# Altium footprint library Altium_Lib.PcbLib: 334 footprints (part 12 of 21)
Each footprint in its own frame and in the unit in brackets; x right, y up, seen from the top. Pads: shape width x height; smd on the part's side, far side on the other; paste and mask are expansions set on the pad; w line width, h text height; cw(c..) or ccw(c..) is an arc to the next point about the centre after c.
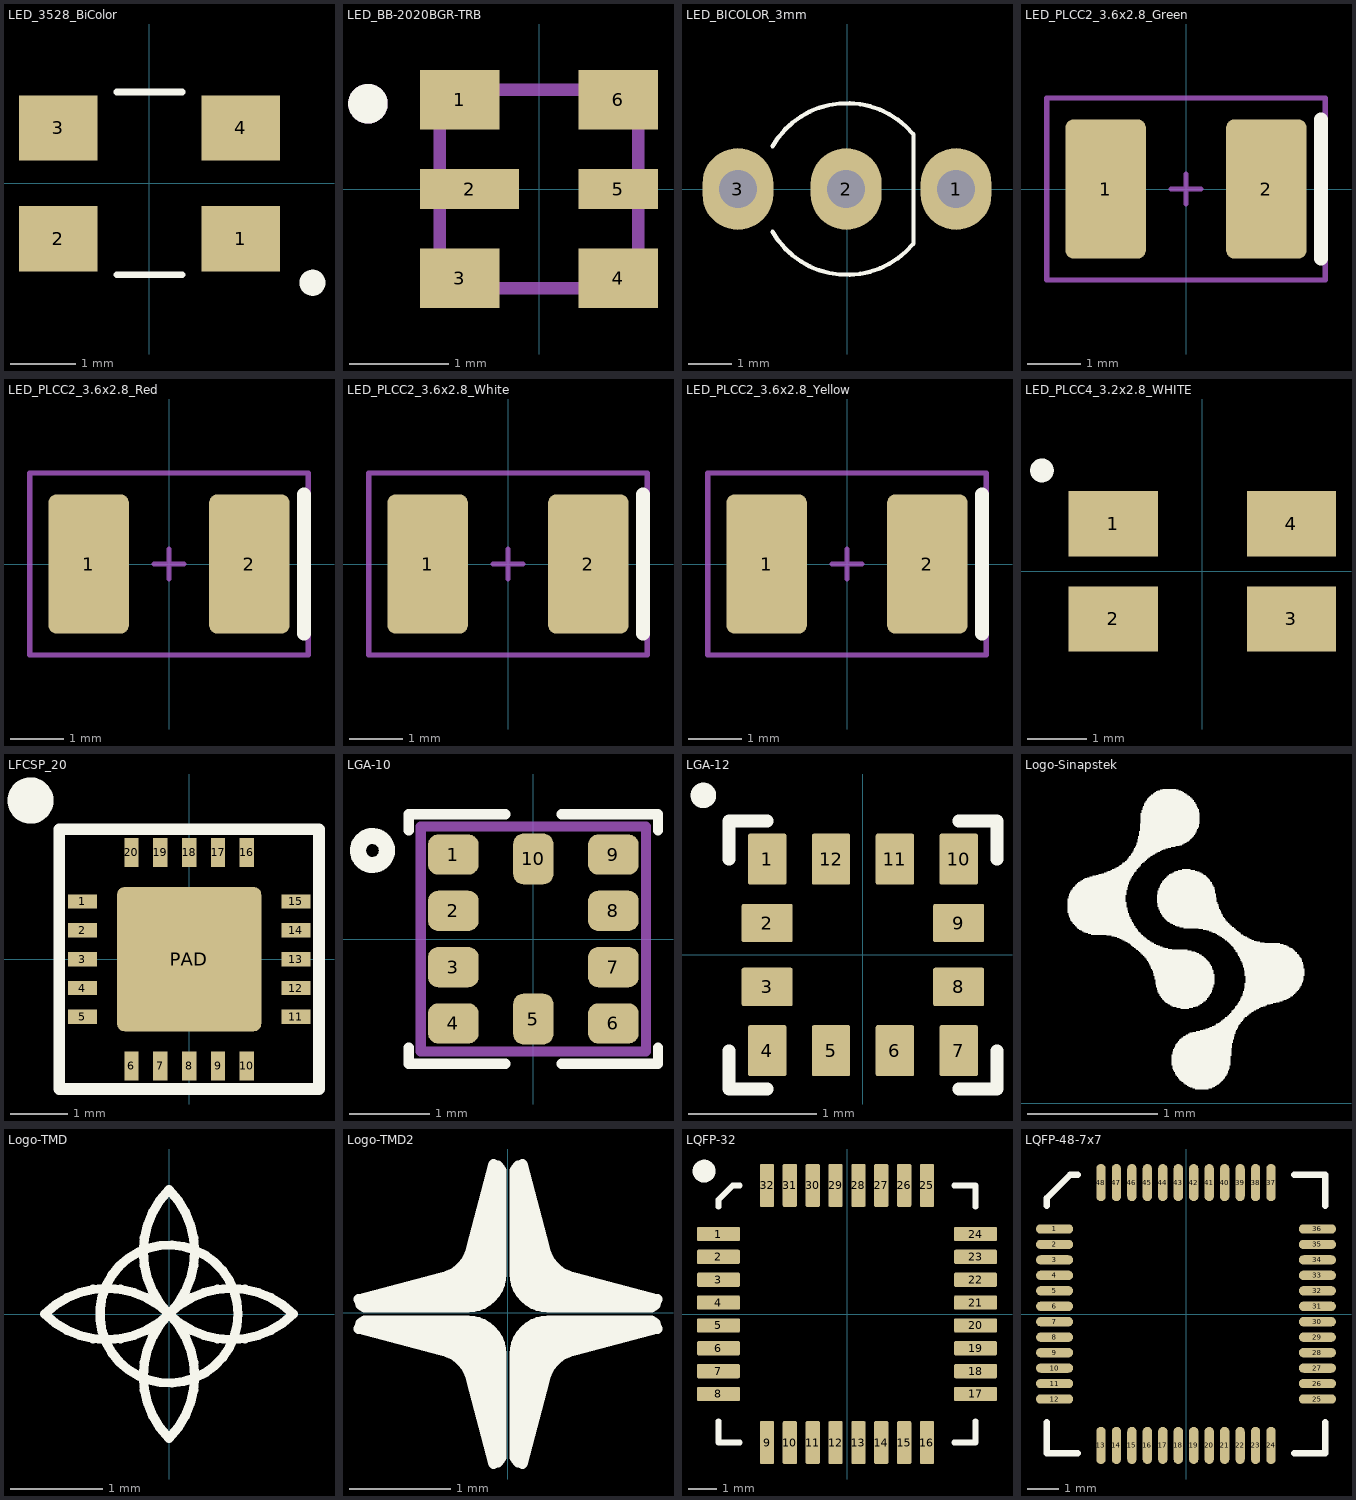
[diagram p11: the footprints below, top view; thin cyan lines are the x and y axes]

## LED_3528_BiColor [mm]
pads (4):
  rect 1.2x1 smd: 1(1.4,-0.85) 2(-1.4,-0.85) 3(-1.4,0.85) 4(1.4,0.85)
Top Overlay:
  circle w0.2: c2.5,-1.525 r0.1
  lines w0.1: -0.5,-1.4 0.5,-1.4 ; -0.5,1.4 0.5,1.4
3D body "LED_3528_Bicolor.step": height 1.9, standoff 0, extent -1.75,-1.4 1.75,1.4

## LED_BB-2020BGR-TRB [mm]
pads (6):
  rect 0.8x0.6 smd: 1(-0.8,0.9) 3(-0.8,-0.9) 4(0.8,-0.9) 6(0.8,0.9)
  rect 1x0.4 smd: 2(-0.7,0)
  rect 0.8x0.4 smd: 5(0.8,0)
Top Overlay:
  circle w0.2: c-1.725,0.86 r0.1
Mechanical 13:
  circle w0.2: c-1.725,0.86 r0.1
Mechanical 15:
  lines w0.127: -1,-1 -1,1 1,1 1,-1 -1,-1
3D body "step_temp.STEP": height 0.75, standoff 0, extent -1,-1 1,1

## LED_BICOLOR_3mm [mil]
pads (3):
  oval 65x75 hole 35: 1(100,0) 2(-0.79,0) 3(-100,0)
Top Overlay:
  lines w3.94: -68.37,-39.07 ccw(c0,0) 60.49,-50.41 ; -68.37,39.07 cw(c0,0) 60.49,50.41 ; 61.02,-50.2 61.02,50.2
3D body "everlight-3MM-LED-RG.STEP": height 274.6, standoff -106.3, extent -107.88,-74.8 107.88,74.8

## LED_PLCC2_3.6x2.8_Green [mm]
height 2
pads (2):
  rrect20% 1.5x2.6 smd: 1(-1.5,0) 2(1.5,0)
Top Overlay:
  lines w0.254: 2.52,-1.3 2.52,1.3
Mechanical 15:
  lines w0.1: -0.275,0 0.275,0 ; 0,-0.275 0,0.275 ; -2.6,-1.7 -2.6,1.7 2.6,1.7 2.6,-1.7 -2.6,-1.7
3D body "LED_PLCC2_White.step": height 1.9, standoff 0, extent -1.75,-1.4 1.75,1.4
3D body: height 1.9, standoff 1.4, extent -1.042,-1.048 1.05,1.048

## LED_PLCC2_3.6x2.8_Red [mm]
height 2
pads (2):
  rrect20% 1.5x2.6 smd: 1(-1.5,0) 2(1.5,0)
Top Overlay:
  lines w0.254: 2.52,-1.3 2.52,1.3
Mechanical 15:
  lines w0.1: -0.275,0 0.275,0 ; 0,-0.275 0,0.275 ; -2.6,-1.7 -2.6,1.7 2.6,1.7 2.6,-1.7 -2.6,-1.7
3D body "LED_PLCC2_White.step": height 1.9, standoff 0, extent -1.75,-1.4 1.75,1.4
3D body: height 1.9, standoff 1.4, extent -1.042,-1.048 1.05,1.048

## LED_PLCC2_3.6x2.8_White [mm]
height 2
pads (2):
  rrect20% 1.5x2.6 smd: 1(-1.5,0) 2(1.5,0)
Top Overlay:
  lines w0.254: 2.52,-1.3 2.52,1.3
Mechanical 15:
  lines w0.1: -0.275,0 0.275,0 ; 0,-0.275 0,0.275 ; -2.6,-1.7 -2.6,1.7 2.6,1.7 2.6,-1.7 -2.6,-1.7
3D body "LED_PLCC2_White.step": height 1.9, standoff 0, extent -1.75,-1.4 1.75,1.4

## LED_PLCC2_3.6x2.8_Yellow [mm]
height 2
pads (2):
  rrect20% 1.5x2.6 smd: 1(-1.5,0) 2(1.5,0)
Top Overlay:
  lines w0.254: 2.52,-1.3 2.52,1.3
Mechanical 15:
  lines w0.1: -0.275,0 0.275,0 ; 0,-0.275 0,0.275 ; -2.6,-1.7 2.6,-1.7 2.6,1.7 -2.6,1.7 -2.6,-1.7
3D body: height 1.9, standoff 1.4, extent -1.042,-1.048 1.05,1.048
3D body "LED_PLCC2_White.step": height 1.9, standoff 0, extent -1.75,-1.4 1.75,1.4

## LED_PLCC4_3.2x2.8_WHITE [mm]
height 2
pads (4):
  rect 1.5x1.1 smd: 1(-1.5,0.8) 2(-1.5,-0.8) 3(1.5,-0.8) 4(1.5,0.8)
Top Overlay:
  circle w0.2: c-2.7,1.7 r0.1
3D body "User Library-HSMx-A2_A3-xx-xxxxx SMD LED PLCC-4.STEP": height 1.9, standoff 0, extent -1.75,-1.4 1.75,1.4
3D body: height 1.9, standoff 1.4, extent -1.042,-1.048 1.05,1.048

## LFCSP_20 [mm]
pads (21):
  rect 0.5x0.25 smd: 1(-1.85,1) 2(-1.85,0.5) 3(-1.85,0) 4(-1.85,-0.5) 5(-1.85,-1) 11(1.85,-1) 12(1.85,-0.5) 13(1.85,0) 14(1.85,0.5) 15(1.85,1)
  rect 0.25x0.5 smd: 6(-1,-1.85) 7(-0.5,-1.85) 8(0,-1.85) 9(0.5,-1.85) 10(1,-1.85) 16(1,1.85) 17(0.5,1.85) 18(0,1.85) 19(-0.5,1.85) 20(-1,1.85)
  rrect10% 2.5x2.5 smd paste-2: PAD(0,0)
Top Overlay:
  circle w0.4: c-2.75,2.75 r0.2
  lines w0.203: -2.25,-2.25 -2.25,2.25 2.25,2.25 2.25,-2.25 -2.25,-2.25
Top Paste:
  region: 0.027,0.507 0.053,0.505 0.079,0.502 0.106,0.497 0.131,0.491 0.157,0.483 0.182,0.474 0.207,0.464 0.231,0.453 0.254,0.44 0.277,0.426 0.299,0.411 0.32,0.395 0.34,0.378 0.359,0.359 0.378,0.34 0.395,0.32 0.411,0.299 0.426,0.277 0.44,0.254 0.453,0.231 0.464,0.207 0.474,0.182 0.483,0.157 0.491,0.131 0.497,0.106 0.502,0.079 0.505,0.053 0.507,0.027 0.508,0 0.507,-0.027 0.505,-0.053 0.502,-0.079 0.497,-0.106 0.491,-0.131 0.483,-0.157 0.474,-0.182 0.464,-0.207 0.453,-0.231 0.44,-0.254 0.426,-0.277 0.411,-0.299 0.395,-0.32 0.378,-0.34 0.359,-0.359 0.34,-0.378 0.32,-0.395 0.299,-0.411 0.277,-0.426 0.254,-0.44 0.231,-0.453 0.207,-0.464 0.182,-0.474 0.157,-0.483 0.131,-0.491 0.106,-0.497 0.079,-0.502 0.053,-0.505 0.027,-0.507 0,-0.508 -0.027,-0.507 -0.053,-0.505 -0.079,-0.502 -0.106,-0.497 -0.131,-0.491 -0.157,-0.483 -0.182,-0.474 -0.207,-0.464 -0.231,-0.453 -0.254,-0.44 -0.277,-0.426 -0.299,-0.411 -0.32,-0.395 -0.34,-0.378 -0.359,-0.359 -0.378,-0.34 -0.395,-0.32 -0.411,-0.299 -0.426,-0.277 -0.44,-0.254 -0.453,-0.231 -0.464,-0.207 -0.474,-0.182 -0.483,-0.157 -0.491,-0.131 -0.497,-0.106 -0.502,-0.079 -0.505,-0.053 -0.507,-0.027 -0.508,0 -0.507,0.027 -0.505,0.053 -0.502,0.079 -0.497,0.106 -0.491,0.131 -0.483,0.157 -0.474,0.182 -0.464,0.207 -0.453,0.231 -0.44,0.254 -0.426,0.277 -0.411,0.299 -0.395,0.32 -0.378,0.34 -0.359,0.359 -0.34,0.378 -0.32,0.395 -0.299,0.411 -0.277,0.426 -0.254,0.44 -0.231,0.453 -0.207,0.464 -0.182,0.474 -0.157,0.483 -0.131,0.491 -0.106,0.497 -0.079,0.502 -0.053,0.505 -0.027,0.507 0,0.508
3D body "LFCSP-20.STEP": height 0.8, standoff 0, extent -2.01,-2.01 2.01,2.01

## LGA-10 [mm]
pads (10):
  rrect50% 0.63x0.5 smd: 1(-0.995,1.05) 2(-0.995,0.35) 3(-0.995,-0.35) 4(-0.995,-1.05) 6(0.995,-1.05) 7(0.995,-0.35) 8(0.995,0.35) 9(0.995,1.05)
  rrect50% 0.5x0.63 smd: 5(0,-0.995) 10(0,0.995)
Top Overlay:
  circle w0.2: c-2,1.1 r0.18
  lines w0.127: -1.55,-1.35 -1.55,-1.55 -0.35,-1.55 ; -1.55,1.35 -1.55,1.55 -0.35,1.55 ; 0.35,-1.55 1.55,-1.55 1.55,-1.35 ; 0.35,1.55 1.55,1.55 1.55,1.35
Mechanical 13:
  lines w0.127: -1.4,-1.4 -1.4,1.4 1.4,1.4 1.4,-1.4 -1.4,-1.4
3D body "LGA-10.STEP": height 1.01, standoff 0, extent -1.5,-1.5 1.5,1.5

## LGA-12 [mm]
pads (12):
  rrect10% 0.3x0.4 smd mask+0.04: 1(-0.75,0.75) 4(-0.75,-0.75) 5(-0.25,-0.75) 6(0.25,-0.75) 7(0.75,-0.75) 10(0.75,0.75) 11(0.25,0.75) 12(-0.25,0.75)
  rrect10% 0.4x0.3 smd mask+0.04: 2(-0.75,0.25) 3(-0.75,-0.25) 8(0.75,-0.25) 9(0.75,0.25)
Top Overlay:
  circle w0.1: c-1.25,1.25 r0.05
  lines w0.1: -1.05,-0.75 -1.05,-1.05 -0.75,-1.05 ; -1.05,0.75 -1.05,1.05 -0.75,1.05 ; 0.75,-1.05 1.05,-1.05 1.05,-0.75 ; 0.75,1.05 1.05,1.05 1.05,0.75
3D body "User Library-lga-2x2x0_9.STEP": height 0.95, standoff 0, extent -1,-1 1,1

## Logo-Sinapstek [mm]
Top Overlay:
  drawing of 2 lines, arcs and shapes, not listed

## Logo-TMD [mm]
Top Overlay:
  circle w0.1: c0,0 r0.75
  lines w0.1: 0,0 ccw(c-0.675,0.675) 0,1.35 ccw(c0.675,0.675) 0,0 ; 0,0 cw(c-0.675,0.675) -1.35,0 cw(c-0.675,-0.675) 0,0 ; 0,0 cw(c-0.675,-0.675) 0,-1.35 cw(c0.675,-0.675) 0,0 ; 0,0 cw(c0.675,-0.675) 1.35,0 cw(c0.675,0.675) 0,0

## Logo-TMD2 [mm]
Top Overlay:
  region: -0.143,1.472 -0.36,0.646 -0.45,0.45 -0.659,0.347 -1.075,0.238 -1.478,0.132 -1.418,0.051 -0.925,0.05 -0.393,0.051 -0.15,0.15 -0.063,0.381 -0.063,1.409
  region: 0.147,1.472 0.364,0.646 0.454,0.45 0.663,0.347 1.079,0.238 1.482,0.132 1.422,0.051 0.929,0.05 0.397,0.051 0.154,0.15 0.067,0.381 0.067,1.409
  region: 0.147,-1.5 0.364,-0.674 0.454,-0.478 0.663,-0.375 1.079,-0.266 1.482,-0.16 1.422,-0.079 0.929,-0.078 0.397,-0.079 0.154,-0.178 0.067,-0.409 0.067,-1.437
  region: -0.143,-1.5 -0.36,-0.674 -0.45,-0.478 -0.659,-0.375 -1.075,-0.266 -1.478,-0.16 -1.418,-0.079 -0.925,-0.078 -0.393,-0.079 -0.15,-0.178 -0.063,-0.409 -0.063,-1.437
  lines w0.1: -1.478,-0.16 -0.659,-0.375 cw(c-0.73,-0.745) -0.36,-0.674 -0.143,-1.5 -0.099,-1.483 -0.063,-1.437 -0.063,-0.409 ccw(c-0.393,-0.409) -0.393,-0.079 -1.418,-0.079 -1.457,-0.103 -1.478,-0.16 ; -1.478,0.132 -0.659,0.347 ccw(c-0.73,0.717) -0.36,0.646 -0.143,1.472 -0.099,1.455 -0.063,1.409 -0.063,0.381 cw(c-0.393,0.381) -0.393,0.051 -1.418,0.051 -1.457,0.075 -1.478,0.132 ; 0.067,-1.437 0.067,-0.409 cw(c0.397,-0.409) 0.397,-0.079 1.422,-0.079 1.461,-0.103 1.482,-0.16 0.663,-0.375 ccw(c0.734,-0.745) 0.364,-0.674 0.147,-1.5 0.103,-1.483 0.067,-1.437 ; 0.067,0.381 ccw(c0.397,0.381) 0.397,0.051 1.422,0.051 1.461,0.075 1.482,0.132 0.663,0.347 cw(c0.734,0.717) 0.364,0.646 0.147,1.472 0.103,1.455 0.067,1.409 0.067,0.381

## LQFP-32 [mm]
pads (32):
  rrect20% 1.5x0.5 smd: 1(-4.5,2.8) 2(-4.5,2) 3(-4.5,1.2) 4(-4.5,0.4) 5(-4.5,-0.4) 6(-4.5,-1.2) 7(-4.5,-2) 8(-4.5,-2.8) 17(4.5,-2.8) 18(4.5,-2) 19(4.5,-1.2) 20(4.5,-0.4) 21(4.5,0.4) 22(4.5,1.2) 23(4.5,2) 24(4.5,2.8)
  rrect20% 0.5x1.5 smd: 9(-2.8,-4.5) 10(-2,-4.5) 11(-1.2,-4.5) 12(-0.4,-4.5) 13(0.4,-4.5) 14(1.2,-4.5) 15(2,-4.5) 16(2.8,-4.5) 25(2.8,4.5) 26(2,4.5) 27(1.2,4.5) 28(0.4,4.5) 29(-0.4,4.5) 30(-1.2,4.5) 31(-2,4.5) 32(-2.8,4.5)
Top Overlay:
  circle w0.4: c-5,5 r0.2
  lines w0.2: -4.5,-3.75 -4.5,-4.5 -3.75,-4.5 ; -4.5,3.75 -4.5,4 -4,4.5 -3.75,4.5 ; 3.75,-4.5 4.5,-4.5 4.5,-3.75 ; 3.75,4.5 4.5,4.5 4.5,3.75
3D body "User Library-LQFP32-2.STEP": height 1.62, standoff -0.01, extent -4.572,-4.607 4.572,4.536

## LQFP-48-7x7 [mm] "hin QFP, 48-Leads, Body 7x7mm, Pitch 0.5mm, IPC Medium Density"
height 1.6
pads (48):
  oval 1.2x0.3 smd mask+0.051: 1(-4.25,2.75) 2(-4.25,2.25) 3(-4.25,1.75) 4(-4.25,1.25) 5(-4.25,0.75) 6(-4.25,0.25) 7(-4.25,-0.25) 8(-4.25,-0.75) 9(-4.25,-1.25) 10(-4.25,-1.75) 11(-4.25,-2.25) 12(-4.25,-2.75) 25(4.25,-2.75) 26(4.25,-2.25) 27(4.25,-1.75) 28(4.25,-1.25) 29(4.25,-0.75) 30(4.25,-0.25) 31(4.25,0.25) 32(4.25,0.75) 33(4.25,1.25) 34(4.25,1.75) 35(4.25,2.25) 36(4.25,2.75)
  oval 0.3x1.2 smd mask+0.051: 13(-2.75,-4.25) 14(-2.25,-4.25) 15(-1.75,-4.25) 16(-1.25,-4.25) 17(-0.75,-4.25) 18(-0.25,-4.25) 19(0.25,-4.25) 20(0.75,-4.25) 21(1.25,-4.25) 22(1.75,-4.25) 23(2.25,-4.25) 24(2.75,-4.25) 37(2.75,4.25) 38(2.25,4.25) 39(1.75,4.25) 40(1.25,4.25) 41(0.75,4.25) 42(0.25,4.25) 43(-0.25,4.25) 44(-0.75,4.25) 45(-1.25,4.25) 46(-1.75,4.25) 47(-2.25,4.25) 48(-2.75,4.25)
Top Overlay:
  lines w0.2: -4.5,-3.5 -4.5,-4.5 -3.5,-4.5 ; -4.5,3.5 -4.5,3.75 -3.75,4.5 -3.5,4.5 ; 3.5,-4.5 4.5,-4.5 4.5,-3.5 ; 3.5,4.5 4.5,4.5 4.5,3.5
3D body "LQFP48_p05.STEP": height 1.6, standoff 0, extent -4.5,-4.5 4.5,4.5